# Altium footprint library PCBLIB.PcbLib: 557 footprints (part 17 of 36)
Each footprint in its own frame and in the unit in brackets; x right, y up, seen from the top. Pads: shape width x height; smd on the part's side, far side on the other; paste and mask are expansions set on the pad; w line width, h text height; cw(c..) or ccw(c..) is an arc to the next point about the centre after c.
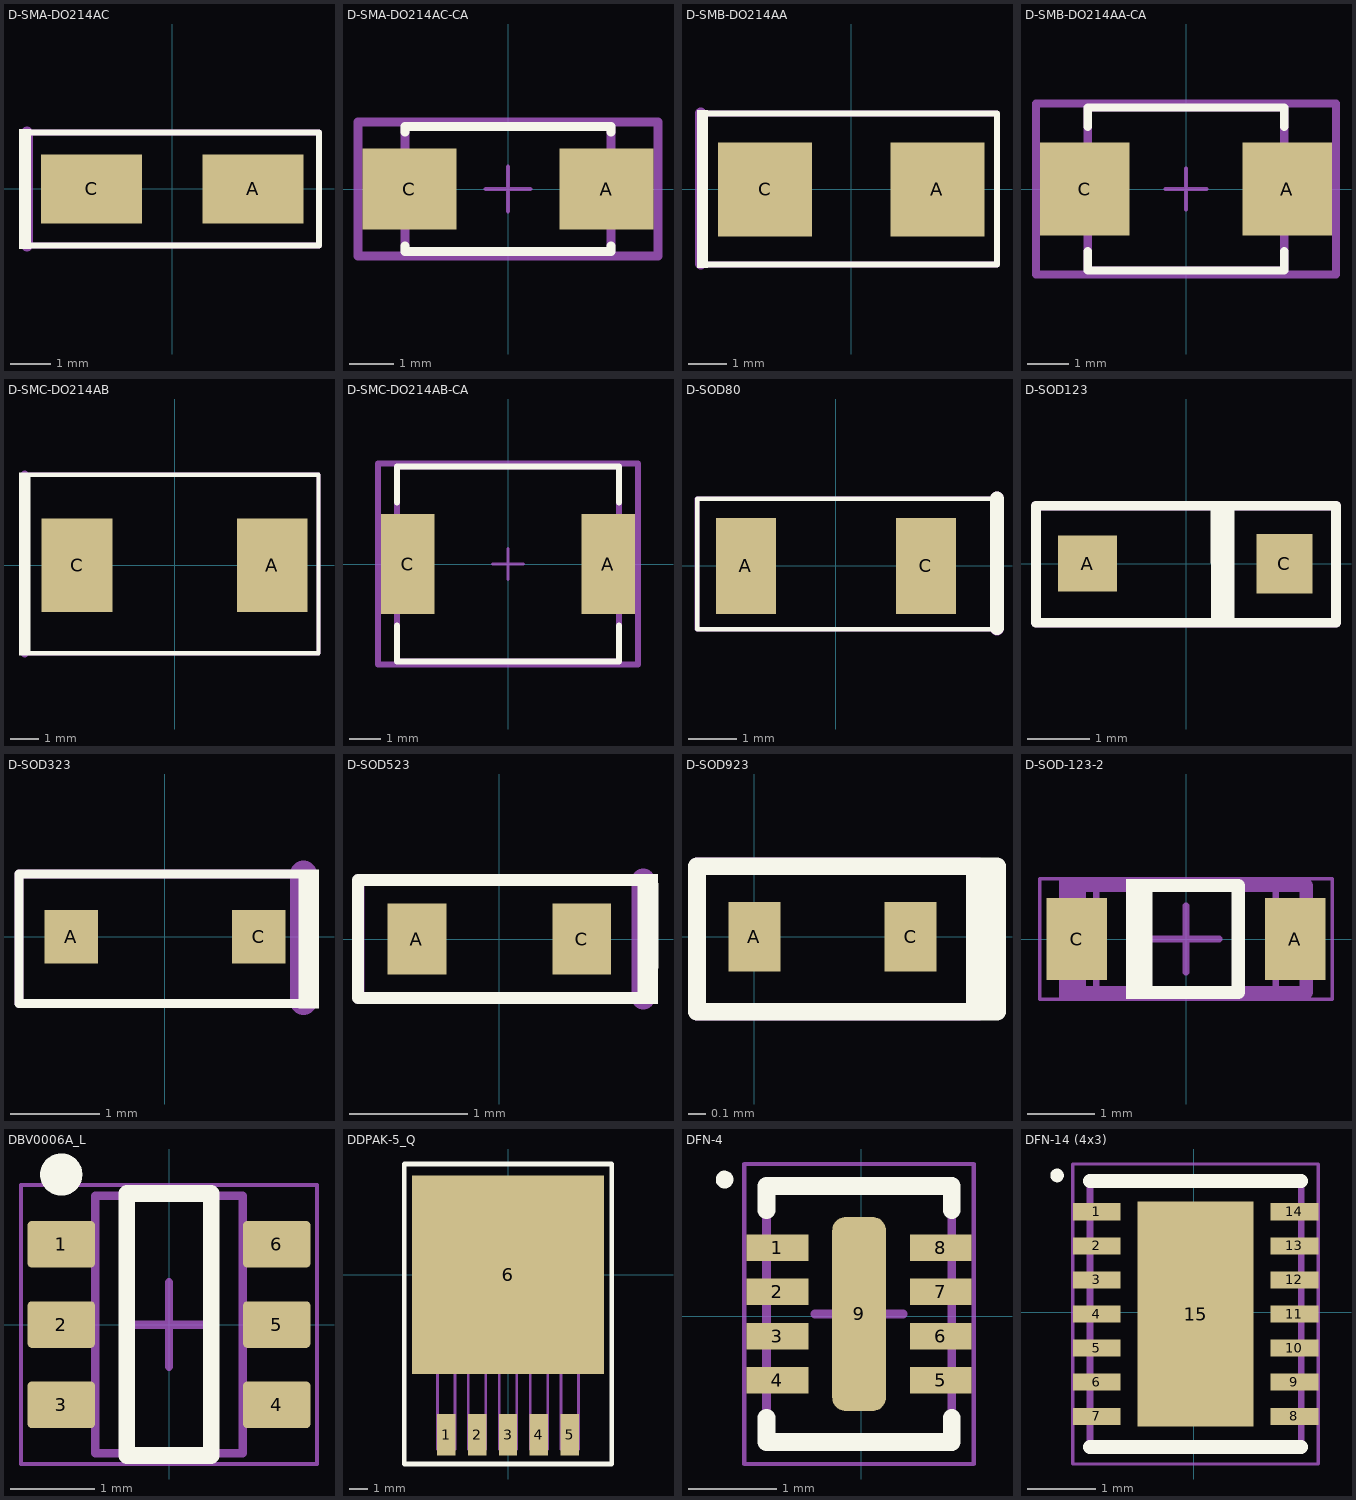
[diagram p16: the footprints below, top view; thin cyan lines are the x and y axes]

## D-SMA-DO214AC [mm]
pads (2):
  rect 2.5x1.7 smd mask+0.051: A(2,0) C(-2,0)
Top Overlay:
  region: -3.8,1.475 -3.508,1.475 -3.508,-1.475 -3.8,-1.475
  lines w0.152: -3.6,-0.546 -3.6,-1.4 3.632,-1.4 3.632,1.4 -3.6,1.4 -3.6,0.635
ASM Top:
  lines w0.152: -3.6,-1.4 3.632,-1.4 3.632,1.4 -3.6,1.4
  lines w0.3: -3.6,-1.4 -3.6,-0.383 -3.6,0.5 -3.6,0.7 ; -3.6,-0.7 -3.6,0.826 -3.6,1.209 -3.6,1.4
  text ".designator" at -0.75,-0.558 h0.8
3D body "User Library-DO-214AC(SMA).STEP": height 2.3, standoff 0.01, extent -2.743,-1.397 2.743,1.397

## D-SMA-DO214AC-CA [mm]
pads (2):
  rect 2.1x1.8 smd paste+0 mask+0: A(2.2,0) C(-2.2,0)
Top Overlay:
  lines w0.2: -2.3,-1.275 -2.3,-1.395 2.3,-1.395 2.3,-1.275 ; -2.3,1.275 -2.3,1.395 2.3,1.395 2.3,1.275
Mechanical 15:
  lines w0.1: -0.5,0 0.5,0 ; 0,-0.5 0,0.5
  lines w0.2: -3.35,-1.495 3.35,-1.495 3.35,1.495 -3.35,1.495 -3.35,-1.495
ASM Top:
  lines w0.2: -2.3,-1.395 -2.3,1.395 2.3,1.395 2.3,-1.395 -2.3,-1.395
  text ".designator" at 0,0.188 h0.8
3D body "Diode_Littelfuse_Inc_SMAJ36CA_eec.STEP": height 2.29, standoff 0, extent -2.552,-1.335 2.553,1.33

## D-SMB-DO214AA [mil]
pads (2):
  rect 96x96 smd mask+0: A(88,0) C(-88,0)
Top Overlay:
  region: -157.48,-79.72 -146.29,-79.72 -146.29,80.71 -157.48,80.71
  lines w6: -153.54,-24 -153.54,-76.77 149,-76.77 149,77.76 -153.54,77.76 -153.54,28
ASM Top:
  lines w6: -153.54,77.76 149,77.76 149,-76.77 -151.57,-76.77 -151.57,76.77
  lines w11.81: -153.54,-75.79 -153.54,77.76
  text ".designator" at -130,-41 h31.5
3D body "User Library-DO-214AA(SMB).STEP": height 104.5, standoff 0.5, extent -110,-78.5 110,77

## D-SMB-DO214AA-CA [mm]
pads (2):
  rect 2.16x2.26 smd paste+0 mask+0: A(2.45,0) C(-2.45,0)
Top Overlay:
  lines w0.2: -2.375,-1.505 -2.375,-1.97 2.375,-1.97 2.375,-1.505 ; -2.375,1.505 -2.375,1.97 2.375,1.97 2.375,1.505
Mechanical 15:
  lines w0.1: -0.5,0 0.5,0 ; 0,-0.5 0,0.5
  lines w0.2: -3.63,-2.07 -3.63,2.07 3.63,2.07 3.63,-2.07 -3.63,-2.07
ASM Top:
  lines w0.2: -2.375,-1.97 2.375,-1.97 2.375,1.97 -2.375,1.97 -2.375,-1.97
  text ".designator" at 0,0.188 h0.8
3D body "Diode_Littelfuse_Inc_SMBJ28CA_eec.STEP": height 2.62, standoff 0, extent -2.7,-1.81 2.7,1.81

## D-SMC-DO214AB [mm]
pads (2):
  rect 2.5x3.3 smd mask+0.051: A(3.45,0) C(-3.45,0)
Top Overlay:
  region: -5.5,3.275 -5.106,3.275 -5.106,-3.175 -5.5,-3.175
  lines w0.152: -5.3,-3.1 5.08,-3.1 5.08,3.2 -5.3,3.2 -5.3,1.406 -5.3,-0.796 -5.3,-3.1
ASM Top:
  lines w0.152: -5.3,-3.1 5.08,-3.1 5.08,3.2 -5.3,3.2
  lines w0.3: -5.3,-3.1 -5.3,1.2 ; -5.3,0.914 -5.3,3.2
  text ".designator" at -4.597,-1.549 h0.8
3D body "User Library-DO-214AB(SMC).STEP": height 2.65, standoff 0.01, extent -4.064,-3.15 4.064,3.15

## D-SMC-DO214AB-CA [mil]
pads (2):
  rect 67.5x126 smd paste+0 mask+0: A(126.25,0) C(-126.25,0)
Top Overlay:
  lines w7.87: -140,-77.76 -140,-123 140,-123 140,-77.76 ; -140,77.76 -140,123 140,123 140,77.76
Mechanical 15:
  lines w3.94: -19.68,0 19.68,0 ; 0,-19.68 0,19.68
  lines w7.87: -163.94,-126.94 163.94,-126.94 163.94,126.94 -163.94,126.94 -163.94,-126.94
ASM Top:
  lines w7.87: -140,-123 140,-123 140,123 -140,123 -140,-123
  text ".designator" at 0,7.41 h31.5
3D body "Diode_Vishay_SMC3K28CAHM3-57_eec.STEP": height 103.23, standoff 0, extent -156.29,-116.24 156.3,116.24

## D-SOD80 [mm]
pads (2):
  rect 1.25x2 smd: A(-1.875,0) C(1.875,0)
Top Overlay:
  lines w0.102: 3.354,-1.321 -2.891,-1.321 -2.891,1.397 3.354,1.397
  lines w0.3: 3.354,-1.294 3.354,1.397
ASM Top:
  lines w0.102: 3.354,-1.321 -2.896,-1.321 -2.896,1.397 3.354,1.397
  lines w0.3: 3.354,-1.299 3.354,1.397
  text ".designator" at -0.9,-0.3 h0.8
3D body "sod80.STEP": height 1.6, standoff 0, extent -1.854,-0.8 1.846,0.8

## D-SOD123 [mm]
pads (2):
  rect 0.95x0.9 smd: A(-1.575,0)
  rect 0.9x0.95 smd: C(1.575,0)
Top Overlay:
  region: 0.771,-0.938 0.4,-0.937 0.4,0.938 0.771,0.937
  lines w0.152: -2.4,-0.95 -2.4,0.925 2.4,0.925 2.4,0.419 2.4,-0.95 -2.4,-0.95
ASM Top:
  lines w0.15: 2.4,-0.95 2.4,0.925
  lines w0.152: 2.4,-0.95 -2.4,-0.95 -2.4,0.925 2.4,0.925
  text ".designator" at -0.7,-0.3 h0.8
3D body "SOD123-DEFAULT.STEP": height 1.28, standoff 0.01, extent -1.846,-0.813 1.854,0.787

## D-SOD323 [mm]
pads (2):
  rect 0.6x0.6 smd: A(-1.05,0) C(1.05,0)
Top Overlay:
  region: 1.5,0.75 1.5,-0.804 1.725,-0.804 1.725,-0.325 1.725,-0.015 1.725,0.285 1.725,0.75
  lines w0.102: -1.634,-0.75 1.55,-0.75 1.55,0.346 1.55,0.7 -1.634,0.7 -1.634,-0.75
ASM Top:
  lines w0.102: 1.55,-0.75 -1.634,-0.75 -1.634,0.7 1.55,0.7
  lines w0.3: 1.55,-0.725 1.55,0.125 1.55,0.7
  text ".designator" at -0.593,-0.229 h0.8
3D body "SOD323-1.STEP": height 1.1, standoff 0, extent -1.309,-0.701 1.291,0.649

## D-SOD523 [mm]
pads (2):
  rect 0.5x0.6 smd: A(-0.7,0) C(0.7,0)
Top Overlay:
  region: 1.175,0.55 1.175,-0.55 1.347,-0.55 1.347,0.044 1.347,0.4 1.347,0.55
  lines w0.102: -1.2,-0.5 1.225,-0.5 1.225,-0.008 1.225,0.258 1.225,0.5 -1.2,0.5 -1.2,-0.5
ASM Top:
  lines w0.102: 1.223,0.5 -1.197,0.5 -1.197,-0.5 1.225,-0.5
  lines w0.2: 1.223,-0.5 1.223,0.095 1.223,0.5
  text ".designator" at -0.838,-0.178 h0.8
3D body "SOD523F.STEP": height 0.7, standoff 0, extent -0.839,-0.45 0.861,0.45

## D-SOD923 [mm]
pads (2):
  rect 0.3x0.4 smd mask+0.051: A(0,0) C(0.9,0)
Top Overlay:
  region: 1.219,0.406 1.219,-0.432 1.397,-0.432 1.397,0.406
  lines w0.102: -0.33,-0.432 1.397,-0.432 1.397,0.406 -0.33,0.406 -0.33,-0.432
ASM Top:
  lines w0.1: -0.33,-0.432 1.29,-0.432 1.29,0.406 -0.33,0.406 -0.33,-0.432
  text ".designator" at 0.279,-0.076 h0.8
3D body "DIODE_SOD-923.STEP": height 0.43, standoff 0, extent -0.098,-0.332 0.952,0.318

## D-SOD-123-2 [mm] "SOD, 2-Leads, Body 2.69x1.6mm"
height 1.35
pads (2):
  rect 0.91x1.22 smd: A(1.635,0) C(-1.635,0)
Top Overlay:
  rectangle: -0.9,-0.9 -0.5,0.9
  lines w0.2: -0.7,-0.8 0.78,-0.8 0.78,0.8 -0.7,0.8
Mechanical 13:
  lines w0.1: -1.345,-0.8 1.345,-0.8 1.345,0.8 -1.345,0.8 -1.345,-0.8
Mechanical 15:
  lines w0.05: -2.19,-0.9 2.19,-0.9 2.19,0.9 -2.19,0.9 -2.19,-0.9
  lines w0.1: -0.5,0 0.5,0 ; 0,-0.5 0,0.5
ASM Top:
  rectangle: -1.9,-0.9 -1.5,0.9
  lines w0.2: -1.8,-0.8 1.8,-0.8 1.8,0.8 -1.8,0.8
  text ".designator" at -0.6,-0.3 h0.8
3D body "SOD123-DEFAULT.STEP": height 1.28, standoff 0.01, extent -1.85,-0.8 1.85,0.8

## DBV0006A_L [mm] "SOT23, 6-Leads, Body 3.05x1.75mm, Pitch 0.95mm, IPC High Density"
height 1.45
pads (6):
  rrect18% 0.8x0.55 smd: 1(-1.275,0.95) 2(-1.275,0) 3(-1.275,-0.95) 4(1.275,-0.95) 5(1.275,0) 6(1.275,0.95)
Top Overlay:
  circle w0.25: c-1.275,1.775 r0.125
  lines w0.2: -0.5,-1.55 0.5,-1.55 0.5,1.55 -0.5,1.55 -0.5,-1.55
Mechanical 15:
  lines w0.05: -1.75,-1.65 -1.75,1.65 1.75,1.65 1.75,-1.65 -1.75,-1.65
  lines w0.1: -0.5,0 0.5,0 ; 0,-0.5 0,0.5
ASM Top:
  lines w0.1: -0.875,-1.525 0.875,-1.525 0.875,1.525 -0.875,1.525 -0.875,-1.525
  text ".designator" at -0.748,-0.127 h0.8
3D body "DBV0006AakaMF06A.stp": height 1.11, standoff -0.01, extent -1.41,-1.461 1.435,1.46

## DDPAK-5_Q [mil]
pads (6):
  rect 40x90 smd: 1(-134,-346.5) 2(-67,-346.5) 3(0,-346.5) 4(67,-346.5) 5(134,-346.5)
  rect 415x430 smd paste-393.7: 6(0,0)
Top Overlay:
  lines w10: -225,-410 -225,240 225,240 225,-410 -225,-410
Top Paste:
  rectangle: -196.85,-208.66 -98.43,-83.66
  region: 196.85,-83.66 98.43,-83.66 98.43,-208.66 196.85,-208.66
  region: 196.85,208.66 98.43,208.66 98.43,83.66 196.85,83.66
  rectangle: -196.85,83.66 -98.43,208.66
  region: 52.17,207.68 -46.26,207.68 -46.26,82.68 52.17,82.68
  region: 52.17,62.01 -46.26,62.01 -46.26,-62.99 52.17,-62.99
  region: 196.85,62.01 98.43,62.01 98.43,-62.99 196.85,-62.99
  region: -98.43,62.5 -196.85,62.5 -196.85,-62.5 -98.43,-62.5
  region: 49.21,-83.66 -49.21,-83.66 -49.21,-208.66 49.21,-208.66
ASM Top:
  lines w6: -185,-208 185,-208 185,208 -185,207.99 -185,-208 ; -153,-378 -153,-208 -115,-208 -115,-378 -153,-378 ; -86,-378 -48,-378 -48,-208 -86,-208 -86,-378 ; -19,-378 -19,-208 19,-208 19,-378 -19,-378 ; 48,-378 86,-378 86,-208 48,-208 48,-378 ; 115,-378 115,-208 153,-208 153,-378 115,-378
  text ".designator" at 0,0 h47.24
3D body "User Library-TO-263BA-1.STEP": height 172.5, standoff -0.04, extent -201.24,-372.99 201.26,180

## DFN-4 [mm] "DFN, 4-Leads, Body 2,00x3,00mm, Pitch 0,50mm, IPC Medium Density"
height 0.8
pads (9):
  rect 0.7x0.3 smd mask+0: 1(-0.95,0.775) 2(-0.95,0.275) 3(-0.95,-0.225) 4(-0.95,-0.725) 5(0.9,-0.725) 6(0.9,-0.225) 7(0.9,0.275) 8(0.9,0.775)
  rrect50% 0.61x2.2 smd paste-10 mask+0: 9(-0.025,0.025)
Top Overlay:
  circle w0.1: c-1.549,1.549 r0.05
  lines w0.2: -1.075,-1.152 -1.075,-1.425 1.025,-1.425 1.025,-1.152 ; -1.075,1.202 -1.075,1.475 1.025,1.475 1.025,1.202
Top Paste:
  rectangle: -0.225,0.2 0.175,0.95
  region: 0.175,-0.125 -0.225,-0.125 -0.225,-0.875 0.175,-0.875
Mechanical 15:
  lines w0.05: -1.325,-1.675 -1.325,1.725 1.275,1.725 1.275,-1.675 -1.325,-1.675
  lines w0.1: -0.525,0.025 0.475,0.025 ; -0.025,-0.475 -0.025,0.525
ASM Top:
  lines w0.1: -1.075,-1.425 1.025,-1.425 1.025,1.475 -1.075,1.475 -1.075,-1.425
  text ".designator" at -0.025,0.025 h1.2
3D body "User Library-My-DFN-8-3x2-0_5.STEP": height 0.8, standoff 0, extent -1.1,-1.525 1.02,1.575

## DFN-14 (4x3) [mm]
height 0.8
pads (15):
  rect 0.7x0.25 smd mask+0: 1(-1.425,1.475) 2(-1.425,0.975) 3(-1.425,0.475) 4(-1.425,-0.025) 5(-1.425,-0.525) 6(-1.425,-1.025) 7(-1.425,-1.525) 8(1.475,-1.525) 9(1.475,-1.025) 10(1.475,-0.525) 11(1.475,-0.025) 12(1.475,0.475) 13(1.475,0.975) 14(1.475,1.475)
  rect 1.7x3.3 smd paste-10 mask+0: 15(0.025,-0.025)
Top Overlay:
  circle w0.1: c-2.007,2.007 r0.05
  lines w0.2: -1.525,-1.975 1.575,-1.975 ; -1.525,1.925 1.575,1.925
Top Paste:
  region: 0.65,-0.15 -0.675,-0.15 -0.675,-0.7 0.65,-0.7
  rectangle: -0.65,0.15 0.675,0.7
  region: 0.65,-1 -0.675,-1 -0.675,-1.55 0.65,-1.55
  rectangle: -0.65,1 0.675,1.55
Mechanical 15:
  lines w0.05: -1.775,-2.225 -1.775,2.175 1.825,2.175 1.825,-2.225 -1.775,-2.225
  lines w0.1: -0.475,-0.025 0.525,-0.025 ; 0.025,-0.525 0.025,0.475
ASM Top:
  lines w0.1: -1.525,-1.975 -1.525,1.925 1.575,1.925 1.575,-1.975 -1.525,-1.975
  text ".designator" at 0.025,-0.025 h1.2
3D body "User Library-DFN-14.STEP": height 0.75, standoff 0, extent -1.475,-2.025 1.525,1.975